# Altium footprint library Chip_Packaging.PcbLib: 101 footprints (part 3 of 7)
Each footprint in its own frame and in the unit in brackets; x right, y up, seen from the top. Pads: shape width x height; smd on the part's side, far side on the other; paste and mask are expansions set on the pad; w line width, h text height; cw(c..) or ccw(c..) is an arc to the next point about the centre after c.
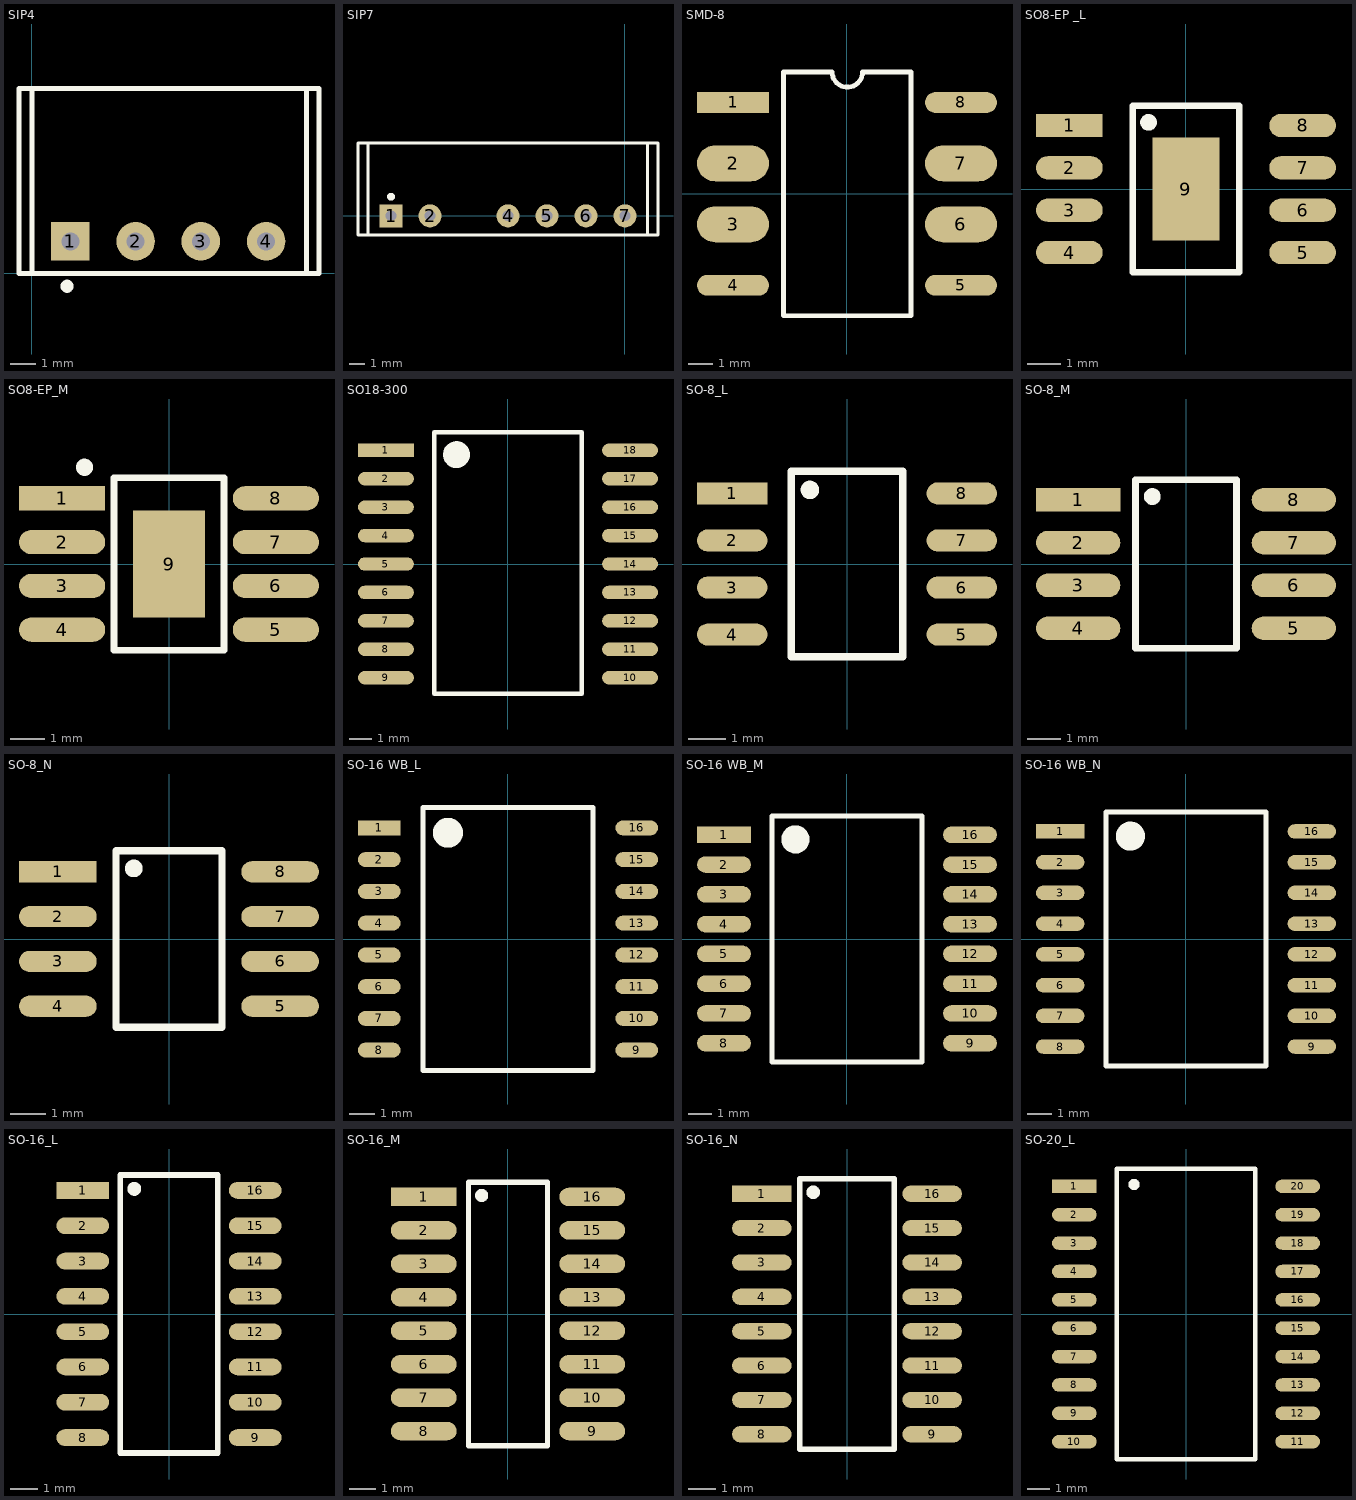
[diagram p2: the footprints below, top view; thin cyan lines are the x and y axes]

## SIP4 [mm]
pads (4):
  rect 1.5x1.5 hole 0.7: 1(1.5,1.25)
  round 1.5 hole 0.7: 2(4.04,1.25) 3(6.58,1.25) 4(9.12,1.25)
Top Overlay:
  circle w0.254: c1.373,-0.5 r0.127
  lines w0.2: 0,0 0,7.2 ; 0.5,0 1.5,0 ; 10.7,0 10.7,7.2 ; -0.5,0 -0.5,7.2 11.18,7.2 11.18,0 -0.5,0
3D body "SIP4.STEP": height 10.25, standoff -2.95, extent -0.532,0 11.152,6

## SIP7 [mm]
pads (6):
  rect 1.5x1.5 hole 0.7: 1(-15.24,0)
  round 1.5 hole 0.7: 2(-12.7,0) 4(-7.62,0) 5(-5.08,0) 6(-2.54,0) 7(0,0)
Top Overlay:
  circle w0.254: c-15.24,1.25 r0.127
  lines w0.2: -16.74,-1.25 -16.74,4.75 ; -16.24,-1.25 -15.24,-1.25 ; 1.46,-1.15 1.46,4.75 ; -17.39,-1.25 -17.39,4.75 2.15,4.75 2.15,-1.25 -17.39,-1.25

## SMD-8 [mm]
pads (8):
  rect 3x0.87 smd: 1(-4.75,3.81)
  oval 3x1.5 smd: 2(-4.75,1.27) 3(-4.75,-1.27) 6(4.75,-1.27) 7(4.75,1.27)
  oval 3x0.87 smd: 4(-4.75,-3.81) 5(4.75,-3.81) 8(4.75,3.81)
Top Overlay:
  lines w0.2: -2.65,-5.08 2.665,-5.08 2.665,5.08 0.65,5.08 cw(c0.015,5.08) -0.62,5.08 -2.65,5.08 -2.65,-5.08
3D body "SMD-8B.STEP": height 4, standoff 0, extent -4.8,-4.925 5,4.925

## SO8-EP _L [mm] "SOIC, 8-Leads, Body 4.9x3.9mm, Pitch 1.27mm, IPC Low Density"
height 1.75
pads (9):
  rect 2x0.7 smd: 1(-3.5,1.905)
  oval 2x0.7 smd: 2(-3.5,0.635) 3(-3.5,-0.635) 4(-3.5,-1.905) 5(3.5,-1.905) 6(3.5,-0.635) 7(3.5,0.635) 8(3.5,1.905)
  rect 2x3.1 smd: 9(0,0)
Top Overlay:
  circle w0.25: c-1.125,2 r0.125
  lines w0.2: -1.6,-2.5 -1.6,2.5 1.6,2.5 1.6,-2.5 -1.6,-2.5
3D body "SO8-4.STEP": height 1.78, standoff 0.01, extent -3.068,-2.445 3.069,2.445

## SO8-EP_M [mm] "SOIC, 8-Leads, Body 4.9x3.9mm, Pitch 1.27mm, IPC Low Density"
height 1.75
pads (9):
  rect 2.5x0.7 smd: 1(-3.1,1.905)
  oval 2.5x0.7 smd: 2(-3.1,0.635) 3(-3.1,-0.635) 4(-3.1,-1.905) 5(3.1,-1.905) 6(3.1,-0.635) 7(3.1,0.635) 8(3.1,1.905)
  rect 2.1x3.1 smd: 9(0,0)
Top Overlay:
  circle w0.25: c-2.45,2.805 r0.125
  lines w0.2: -1.6,-2.5 -1.6,2.5 1.6,2.5 1.6,-2.5 -1.6,-2.5
3D body "SO8-4.STEP": height 1.78, standoff 0.01, extent -3.069,-2.445 3.068,2.445

## SO18-300 [mm] "SOIC, 18-Leads, Body 11.75x7.6mm, Pitch 1.27mm, IPC Medium Density"
height 2.65
pads (18):
  rect 2.5x0.6 smd: 1(-5.45,5.08)
  oval 2.5x0.6 smd: 2(-5.45,3.81) 3(-5.45,2.54) 4(-5.45,1.27) 5(-5.45,0) 6(-5.45,-1.27) 7(-5.45,-2.54) 8(-5.45,-3.81) 9(-5.45,-5.08) 10(5.45,-5.08) 11(5.45,-3.81) 12(5.45,-2.54) 13(5.45,-1.27) 14(5.45,0) 15(5.45,1.27) 16(5.45,2.54) 17(5.45,3.81) 18(5.45,5.08)
Top Overlay:
  circle w0.6: c-2.3,4.885 r0.3
  lines w0.2: -3.3,-5.8 3.3,-5.8 3.3,5.885 -3.3,5.885 -3.3,-5.8
3D body "SOIC18-300.STEP": height 2.65, standoff 0, extent -5.15,-5.765 5.15,5.765

## SO-8_L [mm] "SOIC, 8-Leads, Body 4.9x3.9mm, Pitch 1.27mm, IPC High Density"
height 1.75
pads (8):
  rect 1.9x0.6 smd: 1(-3.1,1.905)
  oval 1.9x0.6 smd: 2(-3.1,0.635) 3(-3.1,-0.635) 4(-3.1,-1.905) 5(3.1,-1.905) 6(3.1,-0.635) 7(3.1,0.635) 8(3.1,1.905)
Top Overlay:
  circle w0.25: c-1,2 r0.125
  lines w0.2: -1.5,-2.5 -1.5,2.5 1.5,2.5 1.5,-2.5 -1.5,-2.5
3D body "SO-8.STEP": height 1.88, standoff -0.03, extent -3.169,-2.504 3.17,2.5

## SO-8_M [mm] "SOIC, 8-Leads, Body 4.9x3.9mm, Pitch 1.27mm, IPC Low Density"
height 1.75
pads (8):
  rect 2.5x0.7 smd: 1(-3.2,1.905)
  oval 2.5x0.7 smd: 2(-3.2,0.635) 3(-3.2,-0.635) 4(-3.2,-1.905) 5(3.2,-1.905) 6(3.2,-0.635) 7(3.2,0.635) 8(3.2,1.905)
Top Overlay:
  circle w0.25: c-1,2 r0.125
  lines w0.2: -1.5,-2.5 1.5,-2.5 1.5,2.5 -1.5,2.5 -1.5,-2.5
3D body "SO-8.STEP": height 1.88, standoff -0.03, extent -3.169,-2.504 3.17,2.5

## SO-8_N [mm] "SOIC, 8-Leads, Body 4.9x3.9mm, Pitch 1.27mm, IPC Medium Density"
height 1.75
pads (8):
  rect 2.2x0.6 smd: 1(-3.15,1.905)
  oval 2.2x0.6 smd: 2(-3.15,0.635) 3(-3.15,-0.635) 4(-3.15,-1.905) 5(3.15,-1.905) 6(3.15,-0.635) 7(3.15,0.635) 8(3.15,1.905)
Top Overlay:
  circle w0.25: c-1,2 r0.125
  lines w0.2: -1.5,-2.5 -1.5,2.5 1.5,2.5 1.5,-2.5 -1.5,-2.5
3D body "SO-8.STEP": height 1.88, standoff -0.03, extent -3.169,-2.504 3.17,2.5

## SO-16 WB_L [mm] "SOIC, 16-Leads, Body 10.3x7.5mm, Pitch 1.27mm, IPC High Density"
height 2.65
pads (16):
  rect 1.7x0.6 smd: 1(-5.15,4.445)
  oval 1.7x0.6 smd: 2(-5.15,3.175) 3(-5.15,1.905) 4(-5.15,0.635) 5(-5.15,-0.635) 6(-5.15,-1.905) 7(-5.15,-3.175) 8(-5.15,-4.445) 9(5.15,-4.445) 10(5.15,-3.175) 11(5.15,-1.905) 12(5.15,-0.635) 13(5.15,0.635) 14(5.15,1.905) 15(5.15,3.175) 16(5.15,4.445)
Top Overlay:
  circle w0.6: c-2.4,4.25 r0.3
  lines w0.2: -3.4,-5.25 -3.4,5.25 3.4,5.25 3.4,-5.25 -3.4,-5.25
3D body "SO-16w.STEP": height 3.5, standoff 0, extent -5.15,-5.1 5.15,5.1

## SO-16 WB_M [mm] "SOIC, 16-Leads, Body 10.3x7.5mm, Pitch 1.27mm, IPC Low Density"
height 2.65
pads (16):
  rect 2.3x0.7 smd: 1(-5.25,4.445)
  oval 2.3x0.7 smd: 2(-5.25,3.175) 3(-5.25,1.905) 4(-5.25,0.635) 5(-5.25,-0.635) 6(-5.25,-1.905) 7(-5.25,-3.175) 8(-5.25,-4.445) 9(5.25,-4.445) 10(5.25,-3.175) 11(5.25,-1.905) 12(5.25,-0.635) 13(5.25,0.635) 14(5.25,1.905) 15(5.25,3.175) 16(5.25,4.445)
Top Overlay:
  circle w0.6: c-2.2,4.25 r0.3
  lines w0.2: -3.2,-5.25 -3.2,5.25 3.2,5.25 3.2,-5.25 -3.2,-5.25
3D body "SO-16w.STEP": height 3.5, standoff 0, extent -5.15,-5.1 5.15,5.1

## SO-16 WB_N [mm] "SOIC, 16-Leads, Body 10.3x7.5mm, Pitch 1.27mm, IPC Medium Density"
height 2.65
pads (16):
  rect 2x0.6 smd: 1(-5.2,4.445)
  oval 2x0.6 smd: 2(-5.2,3.175) 3(-5.2,1.905) 4(-5.2,0.635) 5(-5.2,-0.635) 6(-5.2,-1.905) 7(-5.2,-3.175) 8(-5.2,-4.445) 9(5.2,-4.445) 10(5.2,-3.175) 11(5.2,-1.905) 12(5.2,-0.635) 13(5.2,0.635) 14(5.2,1.905) 15(5.2,3.175) 16(5.2,4.445)
Top Overlay:
  circle w0.6: c-2.3,4.25 r0.3
  lines w0.2: -3.3,-5.25 3.3,-5.25 3.3,5.25 -3.3,5.25 -3.3,-5.25
3D body "SO-16w.STEP": height 3.5, standoff 0, extent -5.15,-5.1 5.15,5.1

## SO-16_L [mm] "16-Pin Small Outline Integrated Circuit 1.27 mm Pitch, IPC High Density"
height 1.75
pads (16):
  rect 1.9x0.6 smd: 1(-3.1,4.445)
  oval 1.9x0.6 smd: 2(-3.1,3.175) 3(-3.1,1.905) 4(-3.1,0.635) 5(-3.1,-0.635) 6(-3.1,-1.905) 7(-3.1,-3.175) 8(-3.1,-4.445) 9(3.1,-4.445) 10(3.1,-3.175) 11(3.1,-1.905) 12(3.1,-0.635) 13(3.1,0.635) 14(3.1,1.905) 15(3.1,3.175) 16(3.1,4.445)
Top Overlay:
  circle w0.25: c-1.25,4.5 r0.125
  lines w0.2: -1.75,-5 1.75,-5 1.75,5 -1.75,5 -1.75,-5
3D body "SO-16.STEP": height 1.7, standoff 0, extent -3,-5.1 3,5.1

## SO-16_M [mm] "16-Pin Small Outline Integrated Circuit 1.27 mm Pitch, IPC Low Density"
height 1.75
pads (16):
  rect 2.5x0.7 smd: 1(-3.2,4.445)
  oval 2.5x0.7 smd: 2(-3.2,3.175) 3(-3.2,1.905) 4(-3.2,0.635) 5(-3.2,-0.635) 6(-3.2,-1.905) 7(-3.2,-3.175) 8(-3.2,-4.445) 9(3.2,-4.445) 10(3.2,-3.175) 11(3.2,-1.905) 12(3.2,-0.635) 13(3.2,0.635) 14(3.2,1.905) 15(3.2,3.175) 16(3.2,4.445)
Top Overlay:
  circle w0.25: c-1,4.5 r0.125
  lines w0.2: -1.5,-5 1.5,-5 1.5,5 -1.5,5 -1.5,-5
3D body "SO-16.STEP": height 1.7, standoff 0, extent -3,-5.1 3,5.1

## SO-16_N [mm] "16-Pin Small Outline Integrated Circuit 1.27 mm Pitch, IPC Medium Density"
height 1.75
pads (16):
  rect 2.2x0.6 smd: 1(-3.15,4.445)
  oval 2.2x0.6 smd: 2(-3.15,3.175) 3(-3.15,1.905) 4(-3.15,0.635) 5(-3.15,-0.635) 6(-3.15,-1.905) 7(-3.15,-3.175) 8(-3.15,-4.445) 9(3.15,-4.445) 10(3.15,-3.175) 11(3.15,-1.905) 12(3.15,-0.635) 13(3.15,0.635) 14(3.15,1.905) 15(3.15,3.175) 16(3.15,4.445)
Top Overlay:
  circle w0.25: c-1.25,4.5 r0.125
  lines w0.2: -1.75,-5 -1.75,5 1.75,5 1.75,-5 -1.75,-5
3D body "SO-16.STEP": height 1.7, standoff 0, extent -3,-5.1 3,5.1

## SO-20_L [mm] "SOIC, 20-Leads, Body 12.8x7.5mm, Pitch 1.27mm, IPC High Density"
height 2.65
pads (20):
  rect 2x0.6 smd: 1(-5,5.715)
  oval 2x0.6 smd: 2(-5,4.445) 3(-5,3.175) 4(-5,1.905) 5(-5,0.635) 6(-5,-0.635) 7(-5,-1.905) 8(-5,-3.175) 9(-5,-4.445) 10(-5,-5.715) 11(5,-5.715) 12(5,-4.445) 13(5,-3.175) 14(5,-1.905) 15(5,-0.635) 16(5,0.635) 17(5,1.905) 18(5,3.175) 19(5,4.445) 20(5,5.715)
Top Overlay:
  circle w0.25: c-2.325,5.8 r0.125
  lines w0.2: -3.1,-6.5 3.1,-6.5 3.1,6.5 -3.1,6.5 -3.1,-6.5
3D body "SO20.STEP": height 2.66, standoff 0, extent -5.315,-6.5 5.315,6.5